# Altium footprint library FULL_CB_REV_D.PcbLib: 35 footprints (part 2 of 3)
Each footprint in its own frame and in the unit in brackets; x right, y up, seen from the top. Pads: shape width x height; smd on the part's side, far side on the other; paste and mask are expansions set on the pad; w line width, h text height; cw(c..) or ccw(c..) is an arc to the next point about the centre after c.
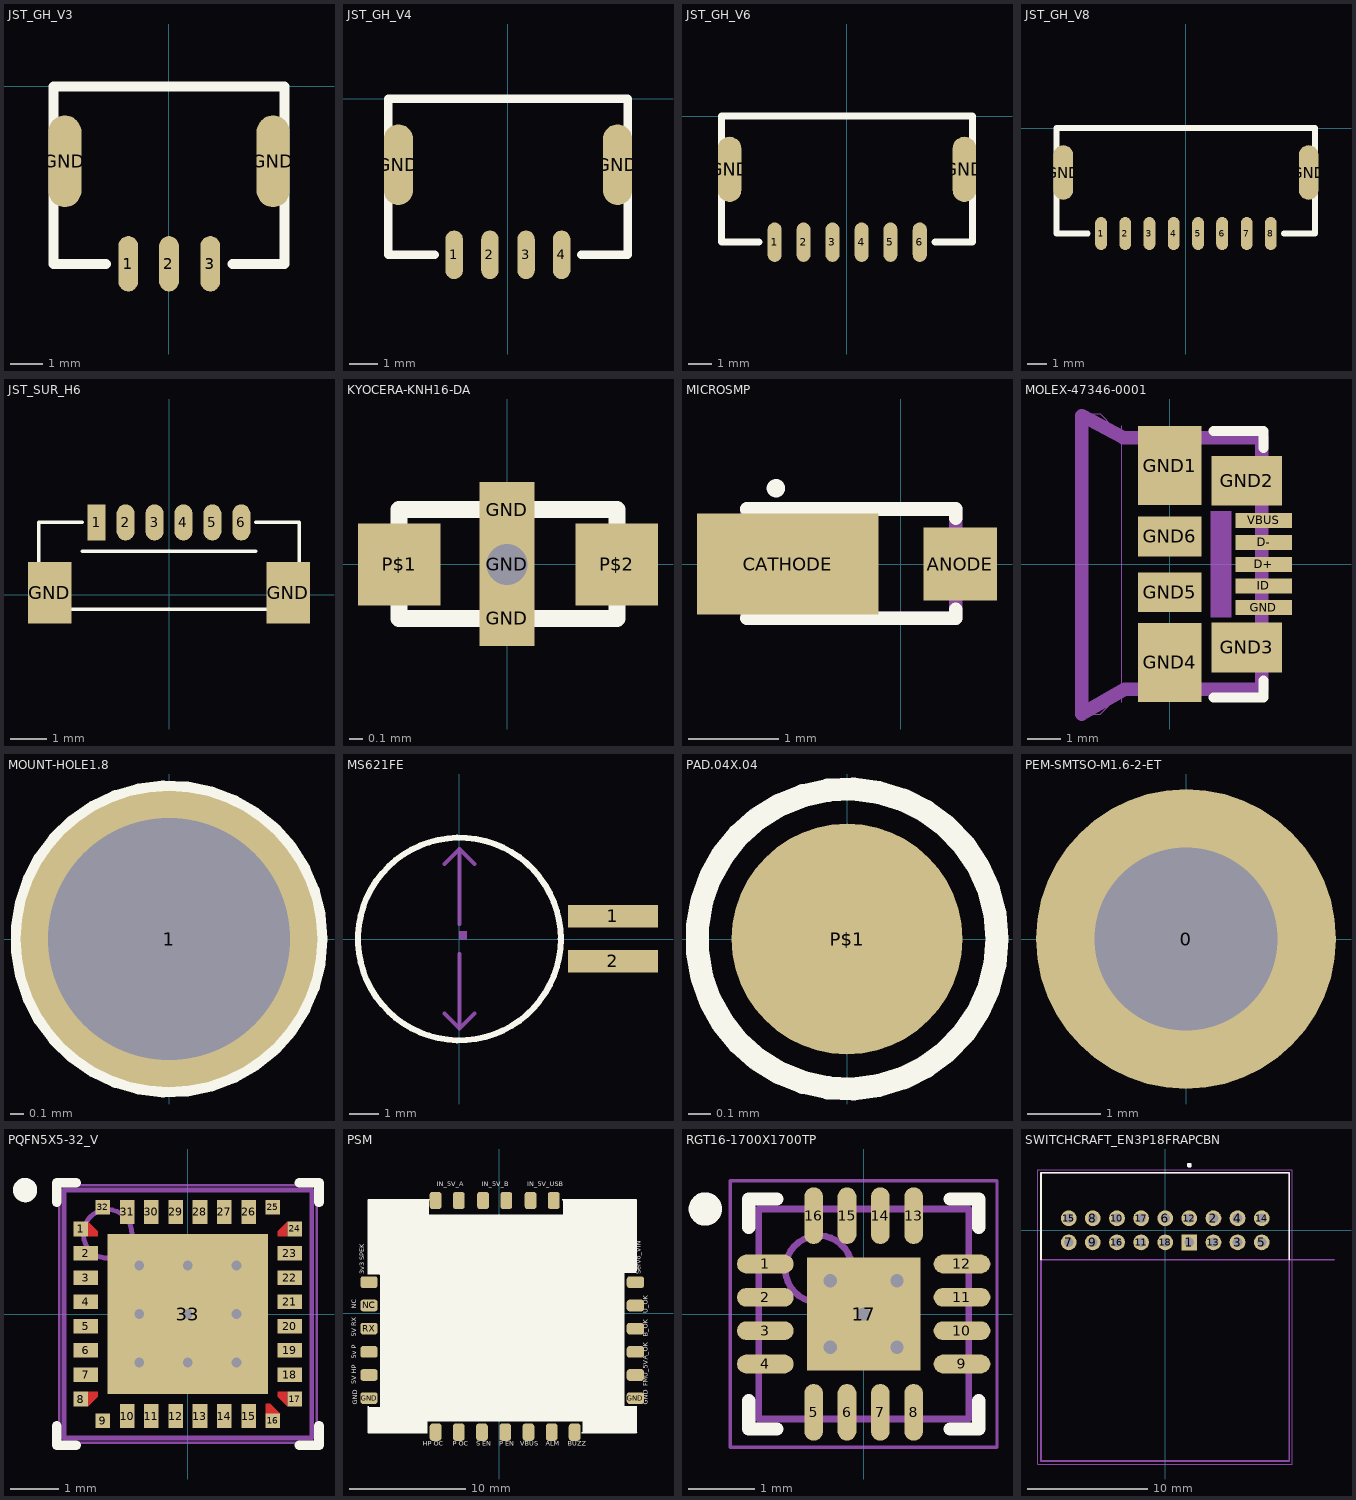
[diagram p1: the footprints below, top view; thin cyan lines are the x and y axes]

## JST_GH_V3 [mil]
pads (5):
  rrect100% 24x67 smd: 1(-49.21,-214.57) 2(0,-214.57) 3(50,-214.57)
  rrect100% 40x111 smd: GND(-125.98,-90.55) GND(126,-90.55)
Top Overlay:
  lines w12: -76.18,-214.57 -139.76,-214.57 -139.76,0 140,0 140,-214.57 77,-214.57
  text "." at -70,-225 h155
3D body "BM03B-GHS-TBT.STEP": height 164.56, standoff -0.8, extent -137.59,-234.88 138,-40

## JST_GH_V4 [mil]
pads (6):
  rrect100% 24x67 smd: 1(-73.82,-214.57) 2(-24.61,-214.57) 3(25,-214.57) 4(74,-214.57)
  rrect100% 40x111 smd: GND(-150.59,-90.55) GND(151,-90.55)
Top Overlay:
  lines w12: -100.79,-214.57 -164.37,-214.57 -164.37,0 165,0 165,-214.57 101,-214.57
  text "." at -95,-225 h155
3D body "BM04B-GHS-TBT.STEP": height 164.56, standoff -0.8, extent -161.8,-235.21 163,-40.33

## JST_GH_V6 [mil]
pads (8):
  rrect100% 24x67 smd: 1(-123.03,-214.57) 2(-73.82,-214.57) 3(-24.61,-214.57) 4(25,-214.57) 5(74,-214.57) 6(124,-214.57)
  rrect100% 40x111 smd: GND(-199.8,-90.55) GND(200,-90.55)
Top Overlay:
  lines w12: -150,-214.57 -213.58,-214.57 -213.58,0 214,0 214,-214.57 150,-214.57
  text "." at -145,-225 h155
3D body "BM06B-GHS-TBT.STEP": height 164.56, standoff -0.8, extent -211.61,-231.88 211.61,-37

## JST_GH_V8 [mil]
pads (10):
  rrect100% 24x67 smd: 1(-172.24,-214.57) 2(-123.03,-214.57) 3(-73.82,-214.57) 4(-24.61,-214.57) 5(25,-214.57) 6(74,-214.57) 7(124,-214.57) 8(173,-214.57)
  rrect100% 40x111 smd: GND(-249.02,-90.55) GND(250,-90.55)
Top Overlay:
  lines w12: -199.21,-214.57 -262.8,-214.57 -262.8,0 263,0 263,-214.57 200,-214.57
  text "." at -195,-225 h155
3D body "BM08B-GHS-TBT.STEP": height 164.56, standoff -0.8, extent -260.65,-233.88 261,-39

## JST_SUR_H6 [mm]
pads (8):
  rect 0.5x1 smd: 1(-2,2)
  rrect100% 0.5x1 smd: 2(-1.2,2) 3(-0.4,2) 4(0.4,2) 5(1.2,2) 6(2,2)
  rect 1.2x1.7 smd: GND(-3.3,0.05) GND(3.3,0.05)
Top Overlay:
  lines w0.1: -2.4,1.2 2.4,1.2 ; -2.4,2 -3.6,2 -3.6,-0.4 3.6,-0.4 3.6,2 2.4,2
  text "." at -2.4,2.8 h0.7
3D body "SM06B-SURS-TF.STEP": height 1.7, standoff -0.05, extent -3.5,-0.4 3.5,2.3

## KYOCERA-KNH16-DA [mil] "KYOCERA-KNH16-DA"
pads (5):
  rect 16x16 smd: GND(0,-15.75) GND(0,16)
  rect 16x16 hole 12: GND(0,0)
  rect 24x24 smd: P$1(-31.5,0) P$2(32,0)
Top Overlay:
  lines w5: -31.5,-15.75 32,-15.75 32,16 -31.5,16 -31.5,-15.75
3D body "KYOCERA-KNH16-DA.STEP": height 13.78, standoff 0, extent -19.68,-9.84 19.68,9.84

## MICROSMP [mil]
pads (2):
  rect 32x32 smd: ANODE(26,0)
  rect 79x44 smd: CATHODE(-49.21,0)
Top Overlay:
  circle w4: c-54.33,33 r2
  lines w6: -66.93,-23.62 24,-23.62 24,-19.68 ; -66.93,24 24,24 24,20
Mechanical 16:
  rectangle: -74.8,-17.72 -68.89,18
  rectangle: 26,-11.81 30,12
  rectangle: -59.05,-21.65 -49.21,22
  lines w1: -66.93,-23.62 24,-23.62 24,24 -66.93,24 -66.93,-23.62
  lines w6: -66.93,-23.62 24,-23.62 24,24 -66.93,24 -66.93,-23.62

## MOLEX-47346-0001 [mil]
pads (11):
  rect 67x18 smd: D+(111,0) D-(111,26) GND(111,-51.18) ID(111,-25.59) VBUS(111,52)
  rect 75x94 smd: GND1(0,117) GND4(0,-116.14)
  rect 83x59 smd: GND2(91,99) GND3(91,-98.43)
  rect 75x47 smd: GND5(0,-32.97) GND6(0,33)
Top Overlay:
  lines w12: 52,-157.48 111,-157.48 111,-137.8 ; 52,158 111,158 111,138
Mechanical 8:
  rectangle: 48,-62.99 73,63
Mechanical 16:
  lines w0: -57.09,-163.39 -57.09,164
  lines w1: -106.3,-177.17 -82.68,-177.17 -55.12,-149.61 107,-149.61 111,-145.67 111,146 107,150 -55.12,150 -82.68,178 -106.3,178 -106.3,-177.17
  lines w16: -104.33,-177.17 -53.15,-147.64 109,-147.64 109,150 -55.12,150 -104.33,176 -104.33,-177.17
3D body "473460001.stp": height 107.09, standoff -8.66, extent -93.7,-157.09 120.08,157.09

## MOUNT-HOLE1.8 [mil]
pads (1):
  round 87 hole 71: 1(0,0)
Top Overlay:
  circle w5: c0,0 r44
Bottom Overlay:
  circle w5: c0,0 r44
  circle w5: c0,0 r44

## MS621FE [mil]
pads (2):
  rect 119x30 smd: 1(203,30) 2(203,-29.53)
Top Overlay:
  circle w8: c0,0 r134
Mechanical 16:
  region: 0,0 10,0 10,10 0,10
  region: 0,0 10,0 10,10 0,10
  lines w5: -19.68,-98.43 0,-118.11 ; -19.68,99 0,119 ; 0,-19.68 0,-118.11 ; 0,20 0,119 ; 20,-98.43 0,-118.11 ; 20,99 0,119
  text "6.8MM" at -47.24,-11.81 h27.56

## PAD.04X.04 [mil]
pads (1):
  rrect100% 40x40 smd paste-78.74: P$1(0,0)
Top Overlay:
  circle w4: c0,0 r26

## PEM-SMTSO-M1.6-2-ET [mm] "Surface mount thread"
height 2
pads (1):
  round 4.1 hole 2.5 paste-2 mask-2: 0(0,0)
Top Paste:
  lines w1: -1.414,-0.707 ccw(c0,0) -0.707,-1.414 ; -1.414,0.707 cw(c0,0) -0.707,1.414 ; 0.707,-1.414 ccw(c0,0) 1.414,-0.707 ; 0.707,1.414 cw(c0,0) 1.414,0.707
Top Solder:
  lines w1: -1.414,-0.707 ccw(c0,0) -0.707,-1.414 ; -1.414,0.707 cw(c0,0) -0.707,1.414 ; 0.707,-1.414 ccw(c0,0) 1.414,-0.707 ; 0.707,1.414 cw(c0,0) 1.414,0.707
3D body "SMTSO-M1.6-2ET.STEP": height 2, standoff -0.48, extent -1.59,-1.83 1.59,1.83

## PQFN5X5-32_V [mm] "QFN, 32-Leads, Body 5x5mm, Pitch 0.5mm, Thermal Pad 3.3x3.3mm, FTDI Recommended"
height 1
pads (33):
  rect 0.3x0.3 smd paste-0.15 mask-0.15: 1(-2.2,1.75) 8(-2.2,-1.75) 9(-1.75,-2.2) 16(1.75,-2.2) 17(2.2,-1.75) 24(2.2,1.75) 25(1.75,2.2) 32(-1.75,2.2)
  rect 0.5x0.3 smd paste-0.15 mask+0.06: 2(-2.1,1.25) 3(-2.1,0.75) 4(-2.1,0.25) 5(-2.1,-0.25) 6(-2.1,-0.75) 7(-2.1,-1.25) 18(2.1,-1.25) 19(2.1,-0.75) 20(2.1,-0.25) 21(2.1,0.25) 22(2.1,0.75) 23(2.1,1.25)
  rect 0.3x0.5 smd paste-0.15 mask+0.06: 10(-1.25,-2.1) 11(-0.75,-2.1) 12(-0.25,-2.1) 13(0.25,-2.1) 14(0.75,-2.1) 15(1.25,-2.1) 26(1.25,2.1) 27(0.75,2.1) 28(0.25,2.1) 29(-0.25,2.1) 30(-0.75,2.1) 31(-1.25,2.1)
  rect 3.3x3.3 smd paste-1.65 mask+0.06: 33(0,0)
via -1,1 diameter 0.5 hole 0.2
via 0,1 diameter 0.5 hole 0.2
via 1,1 diameter 0.5 hole 0.2
via -1,0 diameter 0.5 hole 0.2
via 0,0 diameter 0.5 hole 0.2
via 1,0 diameter 0.5 hole 0.2
via -1,-1 diameter 0.5 hole 0.2
via 0,-1 diameter 0.5 hole 0.2
via 1,-1 diameter 0.5 hole 0.2
Top Layer:
  region: 1.6,-1.85 1.6,-2.05 1.9,-2.05 1.7,-1.85
  region: -2.05,1.6 -1.85,1.6 -1.85,1.7 -2.05,1.9
  region: 2.05,1.6 1.85,1.6 1.85,1.7 2.05,1.9
  region: 2.05,-1.6 1.85,-1.6 1.85,-1.7 2.05,-1.9
  region: -2.05,-1.6 -1.85,-1.6 -1.85,-1.7 -2.05,-1.9
Top Overlay:
  circle w0.25: c-3.35,2.55 r0.125
  lines w0.2: -2.7,-2.3 -2.7,-2.7 -2.3,-2.7 ; -2.7,2.3 -2.7,2.7 -2.3,2.7 ; 2.3,-2.7 2.7,-2.7 2.7,-2.3 ; 2.3,2.7 2.7,2.7 2.7,2.3
Top Paste:
  rectangle: -0.3,1.1 0.3,1.4
  rectangle: -1.3,1.1 -0.7,1.4
  rectangle: 0.7,1.1 1.3,1.4
  rectangle: -0.3,0.6 0.3,0.9
  rectangle: 0.7,0.6 1.3,0.9
  rectangle: -1.3,0.6 -0.7,0.9
  rectangle: -0.3,-0.9 0.3,-0.6
  rectangle: -1.3,-0.9 -0.7,-0.6
  rectangle: 0.7,-0.9 1.3,-0.6
  rectangle: -0.3,-1.4 0.3,-1.1
  rectangle: 0.7,-1.4 1.3,-1.1
  rectangle: -1.3,-1.4 -0.7,-1.1
  rectangle: -1.3,-0.4 -0.7,-0.1
  rectangle: 0.7,-0.4 1.3,-0.1
  rectangle: -0.3,-0.4 0.3,-0.1
  rectangle: 0.7,0.1 1.3,0.4
  rectangle: -1.3,0.1 -0.7,0.4
  rectangle: -0.3,0.1 0.3,0.4
  region: -1.1,1.85 -1.1,2.45 -1.4,2.45 -1.4,1.85
  region: -0.6,1.85 -0.6,2.45 -0.9,2.45 -0.9,1.85
  region: -0.1,1.85 -0.1,2.45 -0.4,2.45 -0.4,1.85
  region: 0.4,1.85 0.4,2.45 0.1,2.45 0.1,1.85
  region: 0.9,1.85 0.9,2.45 0.6,2.45 0.6,1.85
  region: 1.4,1.85 1.4,2.45 1.1,2.45 1.1,1.85
  region: -1.4,-1.85 -1.4,-2.45 -1.1,-2.45 -1.1,-1.85
  region: -0.9,-1.85 -0.9,-2.45 -0.6,-2.45 -0.6,-1.85
  region: -0.4,-1.85 -0.4,-2.45 -0.1,-2.45 -0.1,-1.85
  region: 0.1,-1.85 0.1,-2.45 0.4,-2.45 0.4,-1.85
  region: 0.6,-1.85 0.6,-2.45 0.9,-2.45 0.9,-1.85
  region: 1.1,-1.85 1.1,-2.45 1.4,-2.45 1.4,-1.85
  region: -1.85,1.4 -2.45,1.4 -2.45,1.1 -1.85,1.1
  region: -1.85,0.9 -2.45,0.9 -2.45,0.6 -1.85,0.6
  region: -1.85,0.4 -2.45,0.4 -2.45,0.1 -1.85,0.1
  region: -1.85,-0.1 -2.45,-0.1 -2.45,-0.4 -1.85,-0.4
  region: -1.85,-0.6 -2.45,-0.6 -2.45,-0.9 -1.85,-0.9
  region: -1.85,-1.1 -2.45,-1.1 -2.45,-1.4 -1.85,-1.4
  rectangle: 1.85,-1.4 2.45,-1.1
  rectangle: 1.85,-0.9 2.45,-0.6
  rectangle: 1.85,-0.4 2.45,-0.1
  rectangle: 1.85,0.1 2.45,0.4
  rectangle: 1.85,0.6 2.45,0.9
  rectangle: 1.85,1.1 2.45,1.4
  region: -1.6,1.85 -1.6,2.45 -1.9,2.45 -1.9,2.05 -1.7,1.85
  region: -1.6,-1.85 -1.6,-2.45 -1.9,-2.45 -1.9,-2.05 -1.7,-1.85
  region: -1.85,-1.6 -2.45,-1.6 -2.45,-1.9 -2.05,-1.9 -1.85,-1.7
  region: -1.85,1.6 -2.45,1.6 -2.45,1.9 -2.05,1.9 -1.85,1.7
  region: 1.6,1.85 1.6,2.45 1.9,2.45 1.9,2.05 1.7,1.85
  region: 1.85,-1.6 2.45,-1.6 2.45,-1.9 2.05,-1.9 1.85,-1.7
  region: 1.85,1.6 2.45,1.601 2.45,1.899 2.05,1.9 1.85,1.7
  region: 1.6,-1.85 1.6,-2.45 1.9,-2.45 1.9,-2.05 1.7,-1.85
Top Solder:
  region: -1.96,2.025 -1.96,2.41 -1.54,2.41 -1.54,1.79 -1.725,1.79
  region: -1.96,-2.025 -1.96,-2.41 -1.54,-2.41 -1.54,-1.79 -1.725,-1.79
  region: -2.025,-1.96 -2.41,-1.96 -2.41,-1.54 -1.79,-1.54 -1.79,-1.725
  region: -2.025,1.96 -2.41,1.96 -2.41,1.54 -1.79,1.54 -1.79,1.725
  region: 1.96,2.025 1.96,2.41 1.54,2.41 1.54,1.79 1.725,1.79
  region: 2.025,-1.96 2.41,-1.96 2.41,-1.54 1.79,-1.54 1.79,-1.725
  region: 2.025,1.96 2.41,1.96 2.41,1.54 1.79,1.54 1.79,1.725
  region: 1.96,-2.025 1.96,-2.41 1.54,-2.41 1.54,-1.79 1.725,-1.79
Mechanical 13:
  circle w0.1: c-1.65,1.65 r0.5
  lines w0.1: -2.55,-2.55 -2.55,2.55 2.55,2.55 2.55,-2.55 -2.55,-2.55
Mechanical 15:
  lines w0.05: -2.65,-2.65 -2.65,2.65 2.65,2.65 2.65,-2.65 -2.65,-2.65
  lines w0.1: -0.5,0 0.5,0 ; 0,-0.5 0,0.5
3D body: height 1, standoff 0, extent -2.55,-2.55 2.55,2.55

## PSM [mm]
pads (25):
  rrect50% 1.5x1.016 smd: 5V_HIPOWER(-11.25,-5.318) 5V_PERIPH(-11.25,-3.317) !VBUS_VALID(11.75,0.686) !VDD_BACKUP_VALID(11.75,-1.318) !VDD_BRICK_VALID(11.75,-3.317) GND(-11.25,-7.318) GND(11.75,-7.318) NC(-11.25,0.686) RX(-11.25,-1.318) SERVO_IN(11.75,2.692) SPEK(-11.25,2.692) VDD_5V_IN_PROT(11.75,-5.318)
  rrect50% 1.016x1.5 smd: !VDD_5V_HIPOWER_OC(-5.5,-10.25) !VDD_5V_PERIPH_EN(0.508,-10.25) !VDD_5V_PERIPH_OC(-3.5,-10.25) ALARM(4.521,-10.25) BUZZER_OUT(6.502,-10.25) VBUS(2.515,-10.25) VDD_3V3_SPEKTRUM_EN(-1.5,-10.25) VDD_5V_BACKUP(-1.4,9.75) VDD_5V_BACKUP(0.6,9.75) VDD_BRICK_IN(-5.5,9.75) VDD_BRICK_IN(-3.5,9.75) VDD_VBUS(2.7,9.75) VDD_VBUS(4.7,9.75)
Top Overlay:
  region: -11.3,9.8 -6.1,9.8 -6.1,8.5 5.5,8.5 5.5,9.8 11.8,9.8 11.8,3.5 10.8,3.5 10.8,-8 11.8,-8 11.8,-10.1 11.9,-10.3 7.2,-10.3 7.2,-9.3 -6.2,-9.3 -6.2,-10.2 -6.236,-10.236 -11.303,-10.236 -11.303,-8.103 -11.3,-8.1 -10.3,-8.1 -10.3,3.3 -10.4,3.4 -11.3,3.4
  lines w0.127: -11.325,-8 -11.318,-10.318 -6.23,-10.318 ; -11.325,3.378 -11.325,9.83 -5.953,9.83 ; 5.436,9.83 11.836,9.83 11.836,3.683 ; 7.137,-10.318 11.836,-10.318 11.836,-8
  text "IO and power PixHawk2" at -2.62,-3.81 h0.7
  text "POWER IN" at -0.89,6.35 h0.7
  text "ALM" at 4,-11.6 h0.7
  text "VBUS" at 1.8,-11.6 h0.7
  text "P EN" at 0,-11.6 h0.7
  text "S EN" at -2,-11.6 h0.7
  text "P OC" at -4,-11.6 h0.7
  text "HP OC" at -6.6,-11.6 h0.7
  text "BUZZ" at 5.9,-11.6 h0.7
  text "GND" at -12.1,-7.9 h0.7
  text "FMU_5V" at 13,-6.3 h0.7
  text "A_OK" at 13,-4 h0.7
  text "B_OK" at 13,-2 h0.7
  text "U_OK" at 13,0 h0.7
  text "Servo_VIN" at 12.4,3.4 h0.7
  text "GND" at 13,-7.9 h0.7
  text "5V HP" at -12.2,-6.1 h0.7
  text "5v P" at -12.2,-3.9 h0.7
  text "NC" at -12.193,0.4 h0.7
  text "5V RX" at -12.2,-2 h0.7
  text "3v3 SPEK" at -11.5,3.4 h0.7
  text "IN_5V_USB" at 2.4,10.8 h0.7
  text "IN_5V_B" at -1.5,10.8 h0.7
  text "IN_5V_A" at -5.4,10.8 h0.7
  text "3DR Part# PCA_0007" at -1.82,-4.61 h0.7
Mechanical 16:
  region: 0,0 0.254,0 0.254,0.254 0,0.254
3D body "power.step": height 2.11, standoff 0, extent -11.303,-10.236 11.659,9.728

## RGT16-1700X1700TP [mm] "QFN, 16-Leads, Body 3x3mm, Pitch 0.5mm, Thermal Pad 1.7x1.7mm, TI Recommended"
height 1
pads (17):
  oval 0.85x0.28 smd paste-0.025 mask+0.07: 1(-1.475,0.75) 2(-1.475,0.25) 3(-1.475,-0.25) 4(-1.475,-0.75) 9(1.475,-0.75) 10(1.475,-0.25) 11(1.475,0.25) 12(1.475,0.75)
  oval 0.28x0.85 smd paste-0.025 mask+0.07: 5(-0.75,-1.475) 6(-0.25,-1.475) 7(0.25,-1.475) 8(0.75,-1.475) 13(0.75,1.475) 14(0.25,1.475) 15(-0.25,1.475) 16(-0.75,1.475)
  rect 1.7x1.7 smd paste-0.85 mask+0.07: 17(0,0)
via -0.5,-0.5 diameter 0.5 hole 0.2
via 0.5,-0.5 diameter 0.5 hole 0.2
via -0.5,0.5 diameter 0.5 hole 0.2
via 0,0 diameter 0.5 hole 0.2
via 0.5,0.5 diameter 0.5 hole 0.2
Top Overlay:
  circle w0.25: c-2.375,1.575 r0.125
  lines w0.2: -1.725,-1.3 -1.725,-1.725 -1.3,-1.725 ; -1.725,1.3 -1.725,1.725 -1.3,1.725 ; 1.3,-1.725 1.725,-1.725 1.725,-1.3 ; 1.3,1.725 1.725,1.725 1.725,1.3
Top Paste:
  region: -0.1,0.1 -0.1,0.8 -0.8,0.8 -0.8,0.1
  region: -0.1,-0.1 -0.8,-0.1 -0.8,-0.8 -0.1,-0.8
  region: 0.1,-0.1 0.1,-0.8 0.8,-0.8 0.8,-0.1
  rectangle: 0.1,0.1 0.8,0.8
Mechanical 13:
  circle w0.1: c-0.675,0.675 r0.5
  lines w0.1: -1.575,-1.575 -1.575,1.575 1.575,1.575 1.575,-1.575 -1.575,-1.575
Mechanical 15:
  lines w0.05: -2,-2 -2,2 2,2 2,-2 -2,-2
  lines w0.1: -0.5,0 0.5,0 ; 0,-0.5 0,0.5
3D body: height 1, standoff 0, extent -1.575,-1.575 1.575,1.575

## SWITCHCRAFT_EN3P18FRAPCBN [mm]
pads (18):
  rect 1.308x1.308 hole 0.8: 1(2,-1)
  round 1.308 hole 0.8: 2(4,1) 3(6,-1) 4(6,1) 5(8,-1) 6(0,1) 7(-8,-1) 8(-6,1) 9(-6,-1) 10(-4,1) 11(-2,-1) 12(2,1) 13(4,-1) 14(8,1) 15(-8,1) 16(-4,-1) 17(-2,1) 18(0,-1)
Top Overlay:
  circle w0.2: c2,5.4 r0.1
  lines w0.127: -10.3,-2.44 -10.3,4.77 10.3,4.77 10.3,-2.44
Mechanical 13:
  circle w0.2: c2,5.4 r0.1
  lines w0.127: 14,-2.44 -10.3,-2.44 ; -10.3,-2.44 -10.3,-19.13 10.3,-19.13 10.3,4.77 -10.3,4.77 -10.3,-2.44
  text "PCB EDGE" at 10.6,-2.2 h0.81
Mechanical 15:
  lines w0.05: -10.55,-19.38 -10.55,5.02 10.55,5.02 10.55,-19.38 -10.55,-19.38
3D body "EN3P18FRAPCBN--3DModel-STEP-1.STEP": height 23.32, standoff -2.2, extent -11.915,-38.473 11.915,4.826